# Altium footprint library hphonglib.PcbLib: 703 footprints (part 36 of 44)
Each footprint in its own frame and in the unit in brackets; x right, y up, seen from the top. Pads: shape width x height; smd on the part's side, far side on the other; paste and mask are expansions set on the pad; w line width, h text height; cw(c..) or ccw(c..) is an arc to the next point about the centre after c.
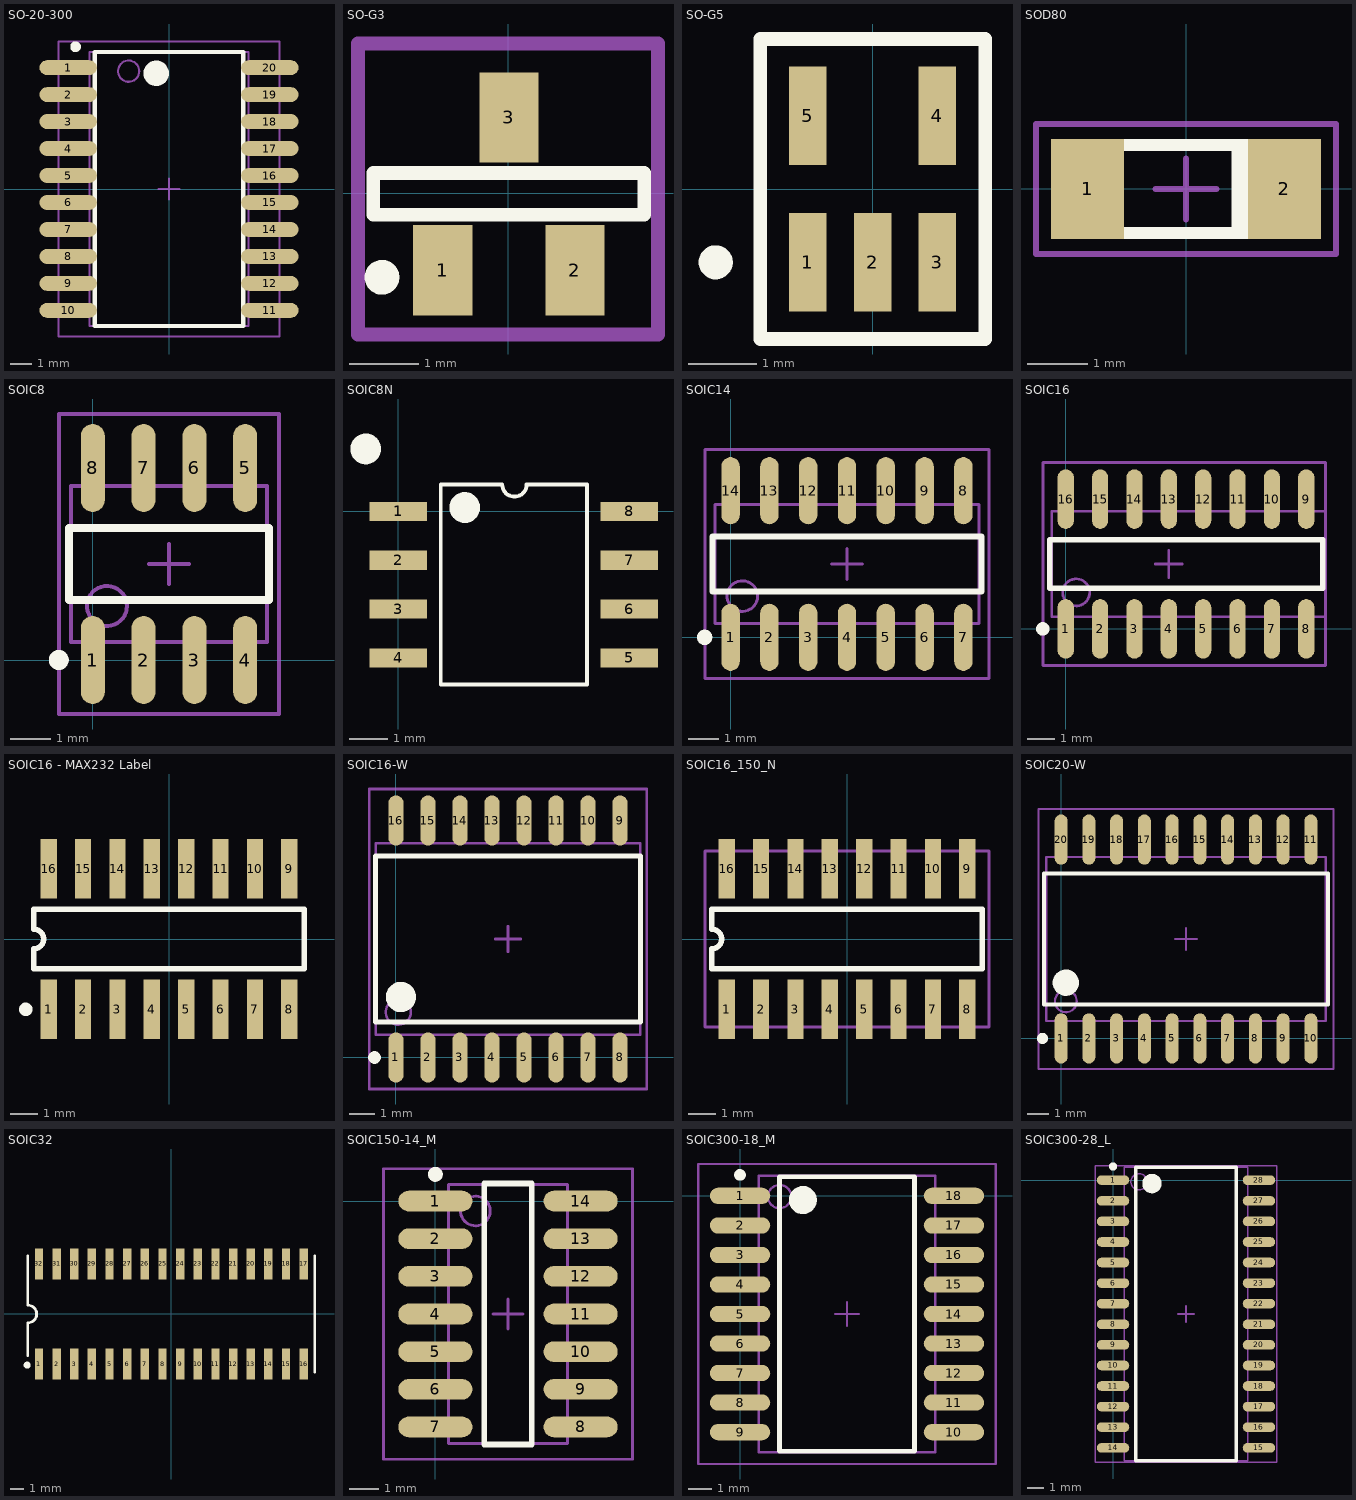
[diagram p35: the footprints below, top view; thin cyan lines are the x and y axes]

## SO-20-300 [mm] ": plastic small outline package; 20 leads; body width 7.5 mm"
height 2
pads (20):
  oval 2.7x0.7 smd: 1(-4.75,5.715) 2(-4.75,4.445) 3(-4.75,3.175) 4(-4.75,1.905) 5(-4.75,0.635) 6(-4.75,-0.635) 7(-4.75,-1.905) 8(-4.75,-3.175) 9(-4.75,-4.445) 10(-4.75,-5.715) 11(4.75,-5.715) 12(4.75,-4.445) 13(4.75,-3.175) 14(4.75,-1.905) 15(4.75,-0.635) 16(4.75,0.635) 17(4.75,1.905) 18(4.75,3.175) 19(4.75,4.445) 20(4.75,5.715)
Top Overlay:
  circle w0.6: c-0.6,5.45 r0.3
  circle w0.25: c-4.4,6.7 r0.125
  lines w0.2: -3.5,-6.45 3.5,-6.45 3.5,6.45 -3.5,6.45 -3.5,-6.45
Mechanical 13:
  circle w0.1: c-1.9,5.55 r0.5
  lines w0.1: -3.75,-6.45 3.75,-6.45 3.75,6.45 -3.75,6.45 -3.75,-6.45
Mechanical 15:
  lines w0.1: -0.5,0 0.5,0 ; 0,-0.5 0,0.5 ; -5.2,-6.95 5.2,-6.95 5.2,6.95 -5.2,6.95 -5.2,-6.95
3D body: height 2.65, standoff 0, extent -5.175,-6.4 5.125,6.4

## SO-G3 [mm]
pads (3):
  rect 0.85x1.3 smd: 1(-0.939,-1.107) 2(0.961,-1.107) 3(0.011,1.093)
Top Overlay:
  circle w0.25: c-1.814,-1.207 r0.125
  lines w0.2: -1.939,-0.307 1.961,-0.307 1.961,0.293 -1.939,0.293 -1.939,-0.307
Mechanical 13:
  lines w0.2: -2.159,-2.032 -2.159,2.159 2.159,2.159 2.159,-2.032 -2.159,-2.032
3D body: height 2.54, standoff 0, extent -1.651,-0.635 1.651,0.635
3D body: height 0.51, standoff 0, extent -1.27,-1.524 -0.635,-0.635
3D body: height 0.51, standoff 0, extent 0.63,-1.524 1.265,-0.635
3D body: height 0.51, standoff 0, extent -0.293,0.621 0.342,1.51

## SO-G5 [mm] "Small Outline; 5 Leads; Body Width 5.2 mm; Pitch 1.27 mm"
pads (5):
  rect 0.55x1.45 smd: 1(-0.954,-1.07) 2(-0.004,-1.07) 3(0.946,-1.07) 4(0.946,1.08) 5(-0.954,1.08)
Top Overlay:
  circle w0.25: c-2.304,-1.07 r0.125
  lines w0.2: -1.654,-2.195 1.646,-2.195 1.646,2.205 -1.654,2.205 -1.654,-2.195
Mechanical 13:
  text ".Designator" at 0.483,-1.93 h2.03
3D body: height 0.89, standoff 0, extent -1.27,-1.778 1.27,1.778

## SOD80 [mm] "4148-SOD80 Diode, 2-Leads, Body 3.4x1.4mm, IPC Medium Density"
height 1.5
pads (2):
  rect 1.2x1.65 smd: 1(-1.625,0) 2(1.625,0)
Top Overlay:
  rectangle: 0.75,-0.725 1.3,0.75
  lines w0.2: 1.325,-0.725 -1.325,-0.725 -1.325,0.725 ; 1.325,-0.7 1.325,0.725 ; -1.325,0.725 1.325,0.725 ; -1.325,0.725 1.325,0.725
Mechanical 13:
  rectangle: -1.8,-0.75 -1.316,0.75
  lines w0.1: -1.8,-0.75 -1.8,0.75 1.8,0.75 1.8,-0.75 -1.8,-0.75
Mechanical 15:
  lines w0.1: -0.5,0 0.5,0 ; 0,-0.5 0,0.5 ; -2.475,-1.075 -2.475,1.075 2.475,1.075 2.475,-1.075 -2.475,-1.075
3D body: height 1.89, standoff 0.1, extent -2,-0.898 -1.6,0.898
3D body: height 1.89, standoff 0.1, extent 1.6,-0.898 2,0.898
3D body: height 1.61, standoff 0.4, extent 0.95,-0.644 1.55,0.574
3D body: height 1.6, standoff 0.4, extent -1.65,-0.625 1.35,0.573
3D body: height 1.89, standoff 0.1, extent -2,-0.9 2,0.896

## SOIC8 [mm] "SOIC, 8-Leads, Body 4.9x3.9mm, Pitch 1.27mm, IPC Medium Density"
height 1.75
pads (8):
  oval 0.6x2.2 smd: 1(0,0) 2(1.27,0) 3(2.54,0) 4(3.81,0) 5(3.81,4.8) 6(2.54,4.8) 7(1.27,4.8) 8(0,4.8)
Top Overlay:
  circle w0.25: c-0.85,0 r0.125
  lines w0.2: -0.595,1.5 -0.595,3.3 4.405,3.3 4.405,1.5 -0.595,1.5
Mechanical 13:
  circle w0.1: c0.355,1.35 r0.5
  lines w0.1: -0.545,0.45 -0.545,4.35 4.355,4.35 4.355,0.45 -0.545,0.45
Mechanical 15:
  lines w0.1: 1.405,2.4 2.405,2.4 ; 1.905,1.9 1.905,2.9 ; -0.845,-1.35 -0.845,6.15 4.655,6.15 4.655,-1.35 -0.845,-1.35
3D body: height 1.75, standoff 0, extent -0.545,0.45 4.355,4.35

## SOIC8N [mm]
pads (8):
  rect 1.5x0.5 smd: 1(0,0) 2(0,-1.27) 3(0,-2.54) 4(0,-3.81) 5(6,-3.81) 6(6,-2.54) 7(6,-1.27) 8(6,0)
Top Overlay:
  circle w0.4: c1.725,0.1 r0.2
  circle w0.4: c-0.85,1.625 r0.2
  lines w0.1: 1.1,-4.5 4.9,-4.5 4.9,0.7 3.335,0.7 cw(c3.017,0.7) 2.7,0.7 1.1,0.7 1.1,-4.5
3D body: height 0.25, standoff 0.01, extent -0.133,-1.518 0.975,-1.002
3D body: height 0.25, standoff 0.01, extent -0.108,-0.243 1,0.273
3D body: height 0.25, standoff 0.01, extent -0.133,-4.068 0.975,-3.552
3D body: height 0.25, standoff 0.01, extent -0.108,-2.793 1,-2.277
3D body: height 0.25, standoff 0.01, extent 5.025,-2.793 6.133,-2.277
3D body: height 0.25, standoff 0.01, extent 5.025,-4.058 6.133,-3.542
3D body: height 0.25, standoff 0.01, extent 5.025,-1.508 6.133,-0.992
3D body: height 0.25, standoff 0.01, extent 5.025,-0.233 6.133,0.283
3D body: height 1.75, standoff 0.25, extent 0.975,-4.55 5.025,0.75
3D body: height 1.76, standoff 1.74, extent 1.317,-0.308 2.133,0.482

## SOIC14 [mm] "SOIC, 14-Leads, Body 8.6x3.9mm, Pitch 1.27mm, IPC Medium Density"
height 1.75
pads (14):
  oval 0.6x2.2 smd: 1(0,0) 2(1.27,0) 3(2.54,0) 4(3.81,0) 5(5.08,0) 6(6.35,0) 7(7.62,0) 8(7.62,4.8) 9(6.35,4.8) 10(5.08,4.8) 11(3.81,4.8) 12(2.54,4.8) 13(1.27,4.8) 14(0,4.8)
Top Overlay:
  circle w0.25: c-0.85,0 r0.125
  lines w0.2: -0.59,1.5 -0.59,3.3 8.21,3.3 8.21,1.5 -0.59,1.5
Mechanical 13:
  circle w0.1: c0.385,1.35 r0.5
  lines w0.1: -0.515,0.45 -0.515,4.35 8.135,4.35 8.135,0.45 -0.515,0.45
Mechanical 15:
  lines w0.1: 3.31,2.4 4.31,2.4 ; 3.81,1.9 3.81,2.9 ; -0.84,-1.35 -0.84,6.15 8.46,6.15 8.46,-1.35 -0.84,-1.35
3D body: height 1.75, standoff 0, extent -0.515,0.45 8.135,4.35

## SOIC16 [mm] "SOIC, 16-Leads, Body 8.6x3.9mm, Pitch 1.27mm, IPC Medium Density"
height 1.75
pads (16):
  oval 0.6x2.2 smd: 1(0,0) 2(1.27,0) 3(2.54,0) 4(3.81,0) 5(5.08,0) 6(6.35,0) 7(7.62,0) 8(8.89,0) 9(8.89,4.8) 10(7.62,4.8) 11(6.35,4.8) 12(5.08,4.8) 13(3.81,4.8) 14(2.54,4.8) 15(1.27,4.8) 16(0,4.8)
Top Overlay:
  circle w0.25: c-0.85,0 r0.125
  lines w0.2: -0.59,1.5 9.5,1.5 9.5,3.3 -0.59,3.3 -0.59,1.5
Mechanical 13:
  circle w0.1: c0.385,1.35 r0.5
  lines w0.1: -0.515,0.45 9.6,0.45 9.6,4.35 -0.515,4.35 -0.515,0.45
Mechanical 15:
  lines w0.1: 3.31,2.4 4.31,2.4 ; 3.81,1.9 3.81,2.9 ; -0.84,-1.35 9.6,-1.35 9.6,6.15 -0.84,6.15 -0.84,-1.35
3D body: height 1.75, standoff 0, extent -0.515,0.45 9.6,4.35

## SOIC16 - MAX232 Label [mm] "Small Outline; 16 Leads; Body Width 3.5 mm; Pitch 1.27 mm"
pads (16):
  rect 0.6x2.2 smd: 1(-4.445,-2.6) 2(-3.175,-2.6) 3(-1.905,-2.6) 4(-0.635,-2.6) 5(0.635,-2.6) 6(1.905,-2.6) 7(3.175,-2.6) 8(4.445,-2.6) 9(4.445,2.6) 10(3.175,2.6) 11(1.905,2.6) 12(0.635,2.6) 13(-0.635,2.6) 14(-1.905,2.6) 15(-3.175,2.6) 16(-4.445,2.6)
Top Overlay:
  circle w0.25: c-5.295,-2.6 r0.125
  lines w0.2: -5,-1.1 5,-1.1 5,1.1 -5,1.1 -5,0.367 cw(c-5,0) -5,-0.367 -5,-1.1
3D body: height 0.25, standoff 0.01, extent -3.433,-3.133 -2.917,-2.025
3D body: height 0.25, standoff 0.01, extent -4.708,-3.108 -4.192,-2
3D body: height 0.25, standoff 0.01, extent -0.883,-3.133 -0.367,-2.025
3D body: height 0.25, standoff 0.01, extent -2.158,-3.108 -1.642,-2
3D body: height 0.25, standoff 0.01, extent 1.642,-3.108 2.158,-2
3D body: height 0.25, standoff 0.01, extent 0.367,-3.083 0.883,-1.975
3D body: height 0.25, standoff 0.01, extent 4.192,-3.133 4.708,-2.025
3D body: height 0.25, standoff 0.01, extent 2.917,-3.108 3.433,-2
3D body: height 0.25, standoff 0.01, extent 2.917,2.025 3.433,3.133
3D body: height 0.25, standoff 0.01, extent 4.192,2 4.708,3.108
3D body: height 0.25, standoff 0.01, extent 0.367,2.025 0.883,3.133
3D body: height 0.25, standoff 0.01, extent 1.642,2 2.158,3.108
3D body: height 0.25, standoff 0.01, extent -2.158,2.025 -1.642,3.133
3D body: height 0.25, standoff 0.01, extent -0.883,2 -0.367,3.108
3D body: height 0.25, standoff 0.01, extent -3.433,2 -2.917,3.108
3D body: height 0.25, standoff 0.01, extent -4.708,2.025 -4.192,3.133
3D body: height 1.75, standoff 0.25, extent -5.004,-2.008 5.012,2.008
3D body: height 1.76, standoff 1.74, extent 1.425,-0.55 2.425,0.825
3D body: height 1.76, standoff 1.74, extent 2.625,-0.55 3.625,0.825
3D body: height 1.76, standoff 1.74, extent 0.225,-0.55 1.225,0.825
3D body: height 1.76, standoff 1.74, extent -0.975,-0.525 0.025,0.8
3D body: height 1.76, standoff 1.74, extent -2,0.05 -1.35,0.25
3D body: height 1.76, standoff 1.74, extent -2.175,-0.525 -1.175,0.8
3D body: height 1.76, standoff 1.74, extent -3.375,-0.525 -2.375,0.8
3D body: height 1.76, standoff 1.74, extent -4.508,-1.583 -3.692,-0.793

## SOIC16-W [mm] "SOIC, 16-Leads, Body 10.3x7.5mm, Pitch 1.27mm, IPC Medium Density"
height 2.67
pads (16):
  oval 0.6x2 smd: 1(0,0) 2(1.27,0) 3(2.54,0) 4(3.81,0) 5(5.08,0) 6(6.35,0) 7(7.62,0) 8(8.89,0) 9(8.89,9.4) 10(7.62,9.4) 11(6.35,9.4) 12(5.08,9.4) 13(3.81,9.4) 14(2.54,9.4) 15(1.27,9.4) 16(0,9.4)
Top Overlay:
  circle w0.6: c0.195,2.4 r0.3
  circle w0.25: c-0.85,0 r0.125
  lines w0.2: -0.805,1.4 -0.805,8 9.695,8 9.695,1.4 -0.805,1.4
Mechanical 13:
  circle w0.1: c0.095,1.8 r0.5
  lines w0.1: -0.805,0.9 -0.805,8.5 9.695,8.5 9.695,0.9 -0.805,0.9
Mechanical 15:
  lines w0.1: 3.945,4.7 4.945,4.7 ; 4.445,4.2 4.445,5.2 ; -1.055,-1.25 -1.055,10.65 9.945,10.65 9.945,-1.25 -1.055,-1.25
3D body: height 2.67, standoff 0, extent -0.805,0.9 9.695,8.5

## SOIC16_150_N [mm] "Small Outline; 16 Leads; Body Width 3.5 mm; Pitch 1.27 mm"
pads (16):
  rect 0.6x2.2 smd: 1(-4.445,-2.6) 2(-3.175,-2.6) 3(-1.905,-2.6) 4(-0.635,-2.6) 5(0.635,-2.6) 6(1.905,-2.6) 7(3.175,-2.6) 8(4.445,-2.6) 9(4.445,2.6) 10(3.175,2.6) 11(1.905,2.6) 12(0.635,2.6) 13(-0.635,2.6) 14(-1.905,2.6) 15(-3.175,2.6) 16(-4.445,2.6)
Top Overlay:
  lines w0.2: -5,-1.1 5,-1.1 5,1.1 -5,1.1 -5,0.367 cw(c-5,0) -5,-0.367 -5,-1.1
Mechanical 15:
  lines w0.1: -5.25,-3.25 -5.25,3.25 5.25,3.25 5.25,-3.25 -5.25,-3.25
3D body: height 1.75, standoff 0, extent -4.9,-2.875 4.9,2.925

## SOIC20-W [mm] "SOIC, 20-Leads, Body 12.8x7.5mm, Pitch 1.27mm, IPC Medium Density"
height 2.65
pads (20):
  oval 0.6x2.3 smd: 1(0,0) 2(1.27,0) 3(2.54,0) 4(3.81,0) 5(5.08,0) 6(6.35,0) 7(7.62,0) 8(8.89,0) 9(10.16,0) 10(11.43,0) 11(11.43,9.1) 12(10.16,9.1) 13(8.89,9.1) 14(7.62,9.1) 15(6.35,9.1) 16(5.08,9.1) 17(3.81,9.1) 18(2.54,9.1) 19(1.27,9.1) 20(0,9.1)
Top Overlay:
  circle w0.25: c-0.85,0 r0.125
  circle w0.6: c0.215,2.55 r0.3
  lines w0.2: -0.785,1.55 12.215,1.55 12.215,7.55 -0.785,7.55 -0.785,1.55
Mechanical 13:
  circle w0.1: c0.215,1.7 r0.5
  lines w0.1: -0.685,0.8 12.115,0.8 12.115,8.3 -0.685,8.3 -0.685,0.8
Mechanical 15:
  lines w0.1: 5.215,4.55 6.215,4.55 ; 5.715,4.05 5.715,5.05 ; -1.035,-1.4 12.465,-1.4 12.465,10.5 -1.035,10.5 -1.035,-1.4
3D body: height 2.65, standoff 0, extent -0.685,0.8 12.115,8.3

## SOIC32 [mm] "Small Outline; 32 Leads; Body Width 5.2 mm; Pitch 1.27 mm"
pads (32):
  rect 0.6x2.2 smd: 1(-9.525,-3.6) 2(-8.255,-3.6) 3(-6.985,-3.6) 4(-5.715,-3.6) 5(-4.445,-3.6) 6(-3.175,-3.6) 7(-1.905,-3.6) 8(-0.635,-3.6) 9(0.635,-3.6) 10(1.905,-3.6) 11(3.175,-3.6) 12(4.445,-3.6) 13(5.715,-3.6) 14(6.985,-3.6) 15(8.255,-3.6) 16(9.525,-3.6) 17(9.525,3.6) 18(8.255,3.6) 19(6.985,3.6) 20(5.715,3.6) 21(4.445,3.6) 22(3.175,3.6) 23(1.905,3.6) 24(0.635,3.6) 25(-0.635,3.6) 26(-1.905,3.6) 27(-3.175,3.6) 28(-4.445,3.6) 29(-5.715,3.6) 30(-6.985,3.6) 31(-8.255,3.6) 32(-9.525,3.6)
Top Overlay:
  circle w0.25: c-10.375,-3.676 r0.125
  lines w0.2: -10.325,-2.996 -10.325,-0.635 ccw(c-10.325,0) -10.325,0.635 -10.325,4.191 ; 10.325,-4.191 10.325,4.191

## SOIC150-14_M [mm] "SOIC, 14-Leads, Body 8.7x3.9mm, Pitch 1.27mm, IPC Low Density"
height 1.76
pads (14):
  oval 2.5x0.7 smd: 1(0,0) 2(0,-1.27) 3(0,-2.54) 4(0,-3.81) 5(0,-5.08) 6(0,-6.35) 7(0,-7.62) 8(4.9,-7.62) 9(4.9,-6.35) 10(4.9,-5.08) 11(4.9,-3.81) 12(4.9,-2.54) 13(4.9,-1.27) 14(4.9,0)
Top Overlay:
  circle w0.25: c0,0.9 r0.125
  lines w0.2: 1.65,-8.21 3.25,-8.21 3.25,0.59 1.65,0.59 1.65,-8.21
Mechanical 13:
  circle w0.1: c1.35,-0.335 r0.5
  lines w0.1: 0.45,-8.185 4.45,-8.185 4.45,0.565 0.45,0.565 0.45,-8.185
Mechanical 15:
  lines w0.1: 1.95,-3.81 2.95,-3.81 ; 2.45,-4.31 2.45,-3.31 ; -1.75,-8.71 6.65,-8.71 6.65,1.09 -1.75,1.09 -1.75,-8.71
3D body: height 0.25, standoff 0.01, extent -0.583,-4.058 0.525,-3.542
3D body: height 0.25, standoff 0.01, extent -0.583,-1.508 0.525,-0.992
3D body: height 0.25, standoff 0.01, extent -0.583,-2.783 0.525,-2.267
3D body: height 0.25, standoff 0.01, extent -0.583,-0.258 0.525,0.258
3D body: height 0.25, standoff 0.01, extent -0.533,-6.608 0.575,-6.092
3D body: height 0.25, standoff 0.01, extent -0.533,-7.883 0.575,-7.367
3D body: height 0.25, standoff 0.01, extent -0.533,-5.358 0.575,-4.842
3D body: height 0.25, standoff 0.01, extent 4.3,-0.233 5.408,0.283
3D body: height 0.25, standoff 0.01, extent 4.3,-2.783 5.408,-2.267
3D body: height 0.25, standoff 0.01, extent 4.3,-1.508 5.408,-0.992
3D body: height 0.25, standoff 0.01, extent 4.3,-4.033 5.408,-3.517
3D body: height 0.25, standoff 0.01, extent 4.35,-6.608 5.458,-6.092
3D body: height 0.25, standoff 0.01, extent 4.35,-5.333 5.458,-4.817
3D body: height 0.25, standoff 0.01, extent 4.35,-7.858 5.458,-7.342
3D body: height 1.76, standoff 1.74, extent 0.767,-0.583 1.583,0.207
3D body: height 1.75, standoff 0, extent 0.45,-8.185 4.45,0.565

## SOIC300-18_M [mm] "SOIC, 18-Leads, Body 11.5x7.5mm, Pitch 1.27mm, IPC Low Density"
height 2.65
pads (18):
  oval 2.6x0.7 smd: 1(0,0) 2(0,-1.27) 3(0,-2.54) 4(0,-3.81) 5(0,-5.08) 6(0,-6.35) 7(0,-7.62) 8(0,-8.89) 9(0,-10.16) 10(9.2,-10.16) 11(9.2,-8.89) 12(9.2,-7.62) 13(9.2,-6.35) 14(9.2,-5.08) 15(9.2,-3.81) 16(9.2,-2.54) 17(9.2,-1.27) 18(9.2,0)
Top Overlay:
  circle w0.25: c0,0.9 r0.125
  circle w0.6: c2.7,-0.18 r0.3
  lines w0.2: 1.7,-10.98 1.7,0.82 7.5,0.82 7.5,-10.98 1.7,-10.98
Mechanical 13:
  circle w0.1: c1.7,-0.03 r0.5
  lines w0.1: 0.8,-11.03 0.8,0.87 8.4,0.87 8.4,-11.03 0.8,-11.03
Mechanical 15:
  lines w0.1: 4.1,-5.08 5.1,-5.08 ; 4.6,-5.58 4.6,-4.58 ; -1.8,-11.53 -1.8,1.37 11,1.37 11,-11.53 -1.8,-11.53
3D body: height 2.65, standoff 0, extent 0.8,-11.03 8.4,0.87

## SOIC300-28_L [mm] "SOIC, 28-Leads, Body 17.9x7.5mm, Pitch 1.27mm, IPC High Density"
height 2.65
pads (28):
  oval 2x0.6 smd: 1(0,0) 2(0,-1.27) 3(0,-2.54) 4(0,-3.81) 5(0,-5.08) 6(0,-6.35) 7(0,-7.62) 8(0,-8.89) 9(0,-10.16) 10(0,-11.43) 11(0,-12.7) 12(0,-13.97) 13(0,-15.24) 14(0,-16.51) 15(9,-16.51) 16(9,-15.24) 17(9,-13.97) 18(9,-12.7) 19(9,-11.43) 20(9,-10.16) 21(9,-8.89) 22(9,-7.62) 23(9,-6.35) 24(9,-5.08) 25(9,-3.81) 26(9,-2.54) 27(9,-1.27) 28(9,0)
Top Overlay:
  circle w0.6: c2.4,-0.205 r0.3
  circle w0.25: c0,0.85 r0.125
  lines w0.2: 1.4,-17.305 7.6,-17.305 7.6,0.795 1.4,0.795 1.4,-17.305
Mechanical 13:
  circle w0.1: c1.6,-0.1 r0.5
  lines w0.1: 0.7,-17.31 8.3,-17.31 8.3,0.8 0.7,0.8 0.7,-17.31
Mechanical 15:
  lines w0.1: 4,-8.255 5,-8.255 ; 4.5,-8.755 4.5,-7.755 ; -1.1,-17.405 10.1,-17.405 10.1,0.895 -1.1,0.895 -1.1,-17.405
3D body: height 2.65, standoff 0, extent 0.7,-17.31 8.3,0.8